# Altium integrated library CoLib.IntLib: 649 symbols (part 2 of 5) (continued)
## DB9-RF
designator J?
D-SUB 9pin,母头,90度; Manufacturer: HARTING; Name: DB-9母头; Ordering NO.: 09661536612; Tips: TUV认证
footprint DB9-RF (DB9 卧式间距1.385 mm,母头)
pins: 1, 2, 3, 4, 5, 6, 7, 8, 9, 10 MH2, 11 MH1

## DB9-RM
designator J?
D-SUB 9pin, 公头,90度; Manufacturer: HARTING; Name: DB-9公头; Ordering NO.: 09651636812; Tips: TUV认证
footprint DB9-RM (DB9 卧式间距1.385 mm,公头)
pins: 1, 2, 3, 4, 5, 6, 7, 8, 9, 10 MH1, 11 MH2

## DB15/VGA
designator J?
D-SUB 15pin,3排,90度,VGA接插件; Manufacturer: 南士; 物料替代型号: 同型; Tips: VGA 15孔卧式座; Name: DB-15,VGA接插件; Ordering NO.: 3排 DB15/VGA座,卧式; Price: 1.5
footprint DB15-R (patch=90mil,100mil,VGA插座)
pins: 1, 2, 3, 4, 5, 6, 7, 8, 9, 10, 11, 12, 13, 14, 15, 16, 17
text: VGA15P

## DB37-RF
designator J?
D-SUB 37pin,母头,90度; Manufacturer: HARTING; Name: DB-37（90度母头）; Ordering NO.: 09654636812; Tips: TUV认证
footprint DB37-RF (37PIN,直插, 弯)
pins: 1, 2, 3, 4, 5, 6, 7, 8, 9, 10, 11, 12, 13, 14, 15, 16, 17, 18, 19, 20, 21, 22, 23, 24, 25, 26, 27, 28, 29, 30, 31, 32, 33, 34, 35, 36, 37, A, B

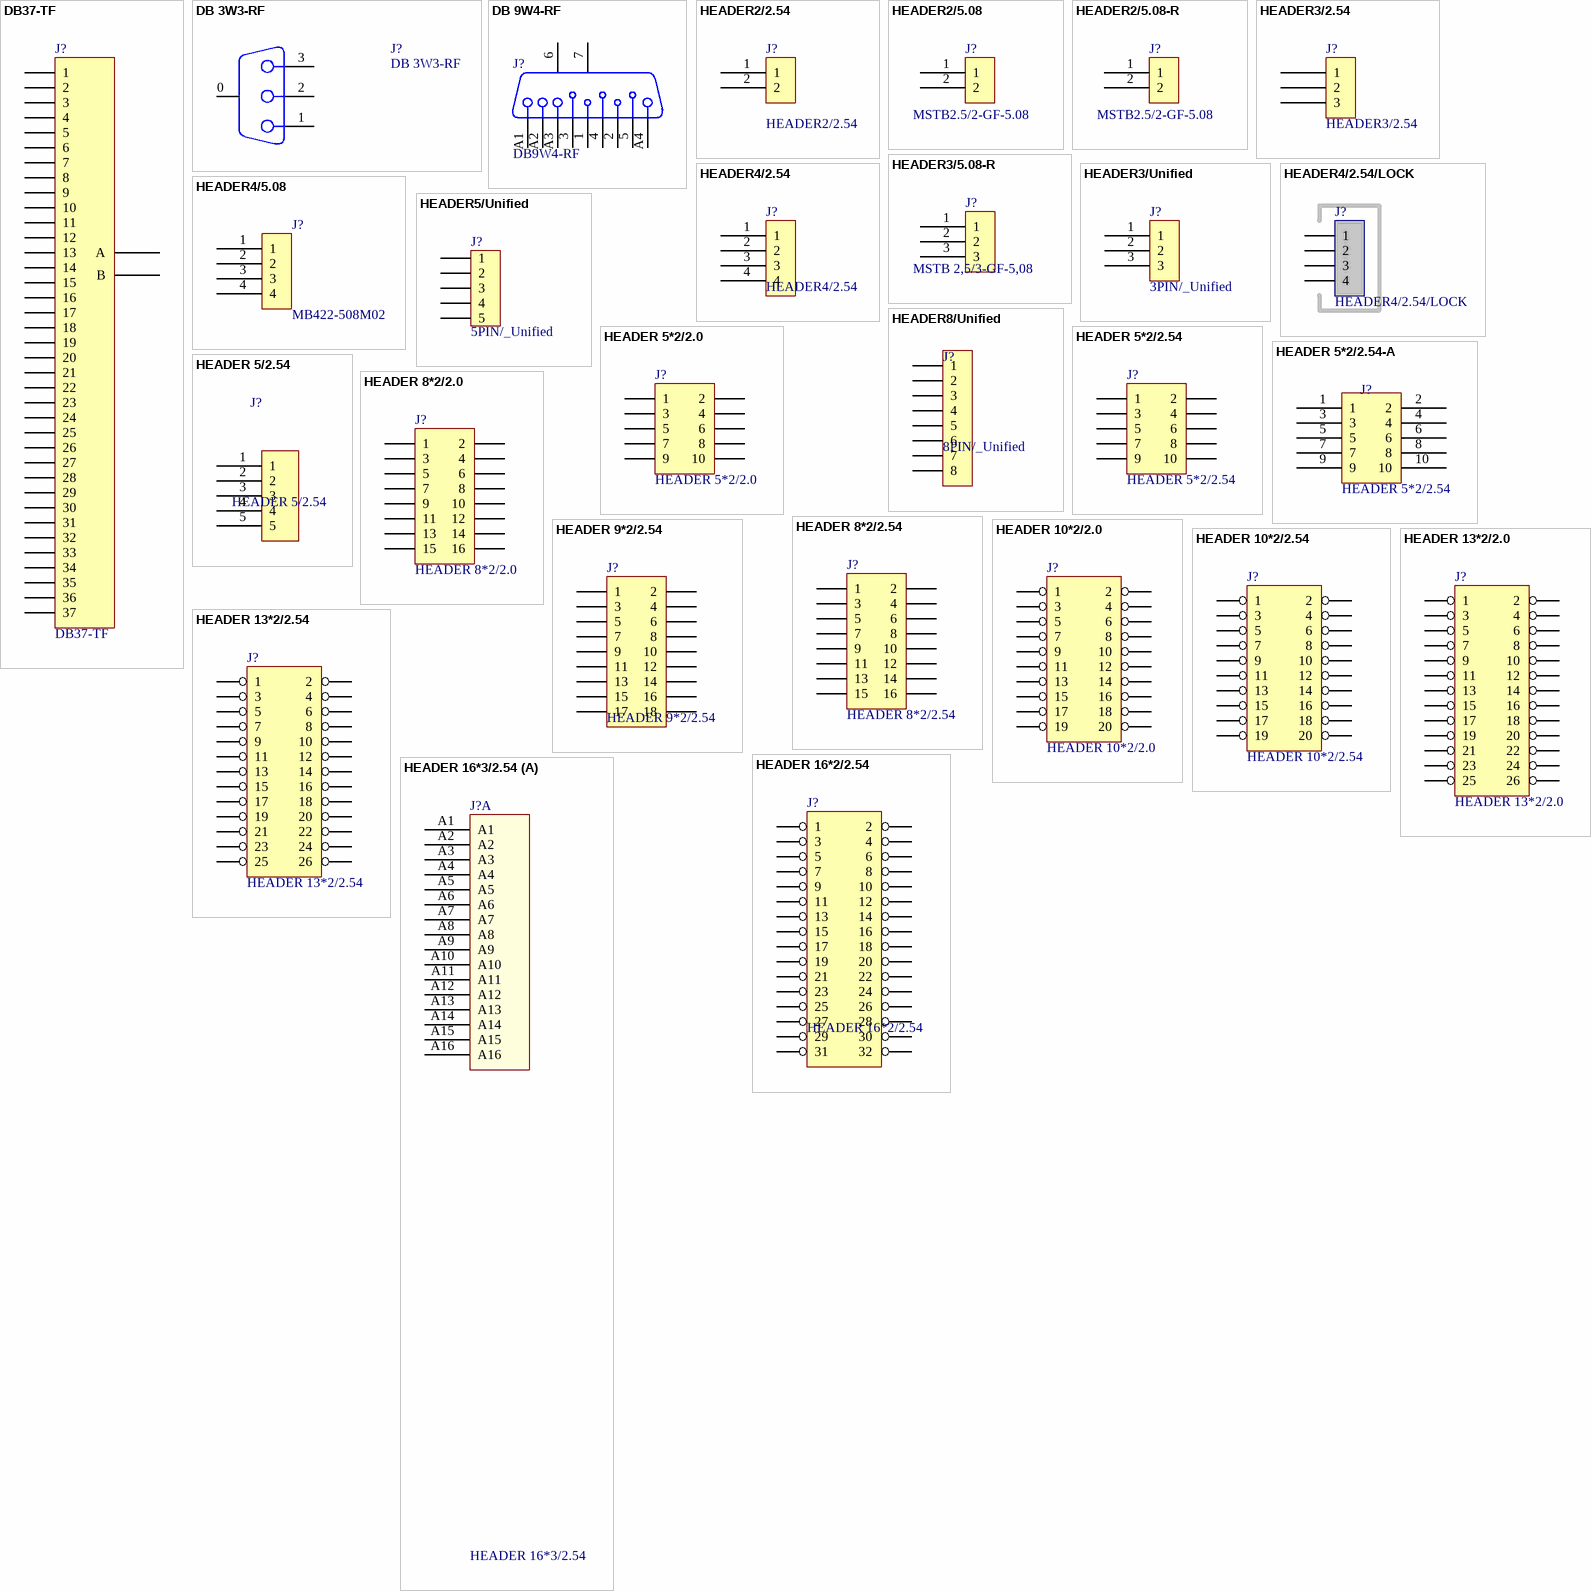
[diagram p10: symbols DB37-TF to HEADER 16*3/2.54]

## DB37-TF
designator J?
D-SUB 37pin,母头,180度; Manufacturer: HARTING; Name: DB-37（180度母头）; Ordering NO.: 09664116503; Tips: TUV认证
footprint DB37-TF (37PIN,直插, 直)
pins: 1, 2, 3, 4, 5, 6, 7, 8, 9, 10, 11, 12, 13, 14, 15, 16, 17, 18, 19, 20, 21, 22, 23, 24, 25, 26, 27, 28, 29, 30, 31, 32, 33, 34, 35, 36, 37, A, B

## DB 3W3-RF
designator J?
D-SUB 3W3,母头,90度; Manufacturer: 优联康; Ordering NO.: UL0.14W8.3W32; Name: DB-3W3
footprint DB3-RF (D-SUB 3W3 弯脚,母座，pitch 6.86mm,)
pins: 0, 1, 2, 3

## DB 9W4-RF
designator J?, comment DB9W4-RF
D-SUB 9W4,母头,90度; Manufacturer: HARTING; Name: DB-9W4; Ordering NO.: TB09693009106
footprint DB9-RF-A (Footprint not found)
pins: 1, 2, 3, 4, 5, 6 MH2, 7 MH1, A1, A2, A3, A4

## HEADER2/2.54
designator J?
2pin,单排,2.54mm间距; Manufacturer: 南士; Name: 2pin,单排,2.54mm间距插针; Price: 0.01; Ordering NO.: 2pin,单排,2.54mm间距
footprint SIP2/2.54 (单排2.54插针, 焊盘: 外径1.5mm,孔径1mm)
pins: 1, 2

## HEADER2/5.08
designator J?, comment MSTB2.5/2-GF-5.08
2pin,单排,5.08mm间距; Manufacturer: Failschild; Name: 端子座; Ordering NO.: MKDS 3/2-5.08
footprint SIP2/5.08
pins: 1, 2

## HEADER2/5.08-R
designator J?, comment MSTB2.5/2-GF-5.08
2pin,单排,5.08mm间距,90度; Manufacturer: 南士; Name: 2pin,单排,5.08mm间距,90度插座; Ordering NO.: MSTB2.5/2-GF-5.08
footprint PMR2/5.08-R
pins: 1, 2

## HEADER3/2.54
designator J?
3pin,单排,2.54mm间距; Manufacturer: 南士; Name: 3pin,单排,2.54mm间距插针; Ordering NO.: 3pin,单排,2.54mm间距
footprint SIP3/2.54 (单排2.54插针, 焊盘: 外径1.5mm,孔径1mm)
footprint 通用3pin,单排,2.54mm间距 (Footprint not found)
pins: 1, 2, 3

## HEADER3/5.08-R
designator J?, comment MSTB 2,5/3-GF-5,08
3pin,单排,5.08mm间距,90度; Manufacturer: Phoenix; Name: 3pin,单排,5.08mm间距,90度插座; Ordering NO.: MSTB 2,5/3-GF-5,08
footprint PMR3/5.08-R
pins: 1, 2, 3

## HEADER3/Unified
designator J?, comment 3PIN/_Unified
3pin,单排,2.54mm间距; Manufacturer: 南士; Ordering NO.: 3pin,单排,2.54mm间距 白座直针; Name: 3pin,单排,2.54mm间距
footprint SIP3/2.0 (单排2.0插针, 焊盘: 外径1.2mm,孔径0.7mm)
footprint SIP3/2.54/LOCK (带锁单排2.54插针, 焊盘: 外径1.5mm,孔径1mm)
pins: 1, 2, 3

## HEADER4/2.54
designator J?
4pin, 单排,2.0mm间距; Manufacturer: 南士; Name: 直插单排插针; Ordering NO.: 单排4pin直针间距2.54mm
footprint SIP4/2.54 (不带锁单排2.54插针, 焊盘: 外径1.5mm,孔径1mm)
pins: 1, 2, 3, 4

## HEADER4/2.54/LOCK
designator J?
4pin,单排,2.54mm间距,白座; Manufacturer: 南士; Name: 4针2.54白座; Ordering NO.: 单排4pin 2.54mm间距 白座直针; Tips: n/a; 物料替代型号: n/a; Price: 0.2
footprint SIP4/2.54/LOCK (带锁单排2.54插针, 焊盘: 外径1.5mm,孔径1mm)
pins: 1, 2, 3, 4

## HEADER4/5.08
designator J?, comment MB422-508M02
4Pin的电源端子,需要2个MB422-508M02组合成1个; Manufacturer: 进联; Name: 端子座; Tips: 给端子板使用; Ordering NO.: MB422-508M02
footprint DIP4/5.08mm (端子板电源端子)
pins: 1, 2, 3, 4

## HEADER5/Unified
designator J?, comment 5PIN/_Unified
5pin,单排,2.54mm间距; Manufacturer: 南士; Name: 5pin,单排,2.54mm间距插针; Ordering NO.: 5pin,单排,2.54mm间距 白座直针
footprint SIP5/2.54/LOCK (带锁单排2.54插针, 焊盘: 外径1.5mm,孔径1mm)
pins: 1, 2, 3, 4, 5

## HEADER8/Unified
designator J?, comment 8PIN/_Unified
8pin,单排,2.54mm间距; Manufacturer: 南士; Name: 8pin,单排,2.54mm间距插针; Ordering NO.: 8pin,单排,2.54mm间距
footprint SIP8/2.54 (Footprint not found)
pins: 1, 2, 3, 4, 5, 6, 7, 8

## HEADER 5*2/2.0
designator J?
10pin, 双排,2.0mm间距; Manufacturer: 南士; Tips: 10直针2.0; Name: 10pin, 双排,2.0mm间距插针; Ordering NO.: 双排10pin直针,间距2.0mm; 物料替代型号: n/a; Price: 0.10
footprint DIP10/2.0 (间距2.0插针,焊盘:外径1.4mm.孔径0.7mm)
pins: 1, 2, 3, 4, 5, 6, 7, 8, 9, 10

## HEADER 5*2/2.54
designator J?
简易牛角座, 10pin,双排, 2.54mm间距; Manufacturer: 南士; Ordering NO.: 302S-10P; Name: 简易牛角座
footprint IDC2*5/2.54 (2.54间距插针, 焊盘:外径1.57mm.孔径0.9mm)
pins: 1, 2, 3, 4, 5, 6, 7, 8, 9, 10

## HEADER 5*2/2.54-A
designator J?, comment HEADER 5*2/2.54
10pin,双排, 2.54mm间距; Manufacturer: 南士; Name: 10pin,双排, 2.54mm间距插针; Ordering NO.: 10pin,双排, 2.54mm间距
footprint DIP10/2.54 (Footprint not found)
pins: 1, 2, 3, 4, 5, 6, 7, 8, 9, 10

## HEADER 5/2.54
designator J?
5pin,单排, 2.54mm间距; Manufacturer: 南士; Name: 5pin,单排, 2.54mm间距插针; Ordering NO.: 5pin,单排, 2.54mm间距
footprint SIP5/2.54 (Footprint not found)
pins: 1, 2, 3, 4, 5

## HEADER 8*2/2.0
designator J?
16pin,双排,2.0mm间距; Manufacturer: 南士; 物料替代型号: 国产通用; Name: 16pin,双排,2.0mm间距 插针; Ordering NO.: 针16pin 2.0间距; Tips: n/a; Price: 0.24
footprint DIP16/2.0 (Footprint not found)
pins: 1, 2, 3, 4, 5, 6, 7, 8, 9, 10, 11, 12, 13, 14, 15, 16

## HEADER 8*2/2.54
designator J?
16pin,双排,2.54mm间距; Manufacturer: 南士; 物料替代型号: 国产通用; Tips: 镀金双排针; Name: 16pin,双排,2.54mm间距插针; Ordering NO.: 镀金双排针16pin 2.54间距; Price: 0.24
footprint DIP16/2.54 (Footprint not found)
pins: 1, 2, 3, 4, 5, 6, 7, 8, 9, 10, 11, 12, 13, 14, 15, 16

## HEADER 9*2/2.54
designator J?
18pin,双排,2.54mm间距; Manufacturer: 南士; 物料替代型号: 国产通用; Tips: 镀金双排针; Name: 18pin,双排,2.54mm间距插针; Ordering NO.: 镀金双排针18pin 2.54间距; Price: 0.24
footprint DIP18/2.54 (Footprint not found)
pins: 1, 2, 3, 4, 5, 6, 7, 8, 9, 10, 11, 12, 13, 14, 15, 16, 17, 18

## HEADER 10*2/2.0
designator J?
20pin, 双排,2.0mm间距; Manufacturer: 南士; Name: 20pin, 双排,2.0mm间距插针; Price: 0.4; Ordering NO.: 20pin, 双排,2.0mm间距
footprint DIP20/2.0 (Footprint not found)
pins: 1, 2, 3, 4, 5, 6, 7, 8, 9, 10, 11, 12, 13, 14, 15, 16, 17, 18, 19, 20

## HEADER 10*2/2.54
designator J?
20pin, 双排,2.54mm间距; Manufacturer: 南士; Name: 20pin, 双排,2.54mm间距插针; Price: 0.4; Ordering NO.: 20pin, 双排,2.54mm间距
footprint DIP20/2.54 (Footprint not found)
pins: 1, 2, 3, 4, 5, 6, 7, 8, 9, 10, 11, 12, 13, 14, 15, 16, 17, 18, 19, 20

## HEADER 13*2/2.0
designator J?
26pin, 双排,2.0mm间距; Manufacturer: 南士; Name: 26pin, 双排,2.0mm间距插针; Ordering NO.: 26pin, 双排,2.0mm间距
footprint DIP26/2.0 (间距2.0插针,焊盘:外径1.4mm.孔径0.7mm)
pins: 1, 2, 3, 4, 5, 6, 7, 8, 9, 10, 11, 12, 13, 14, 15, 16, 17, 18, 19, 20, 21, 22, 23, 24, 25, 26

## HEADER 13*2/2.54
designator J?
26pin, 双排,2.54mm间距; Manufacturer: 南士; Name: 26pin, 双排,2.54mm间距插针; Ordering NO.: 26pin, 双排,2.54mm间距
footprint DIP26/2.54 (2.54间距插针, 焊盘:外径1.57mm.孔径0.9mm)
pins: 1, 2, 3, 4, 5, 6, 7, 8, 9, 10, 11, 12, 13, 14, 15, 16, 17, 18, 19, 20, 21, 22, 23, 24, 25, 26

## HEADER 16*2/2.54
designator J?
32pin, 双排,2.54mm间距; Manufacturer: 南士; Name: 32pin, 双排,2.54mm间距插针; Ordering NO.: 32pin, 双排,2.54mm间距
footprint DIP32/2.54 (Footprint not found)
pins: 1, 2, 3, 4, 5, 6, 7, 8, 9, 10, 11, 12, 13, 14, 15, 16, 17, 18, 19, 20, 21, 22, 23, 24, 25, 26, 27, 28, 29, 30, 31, 32

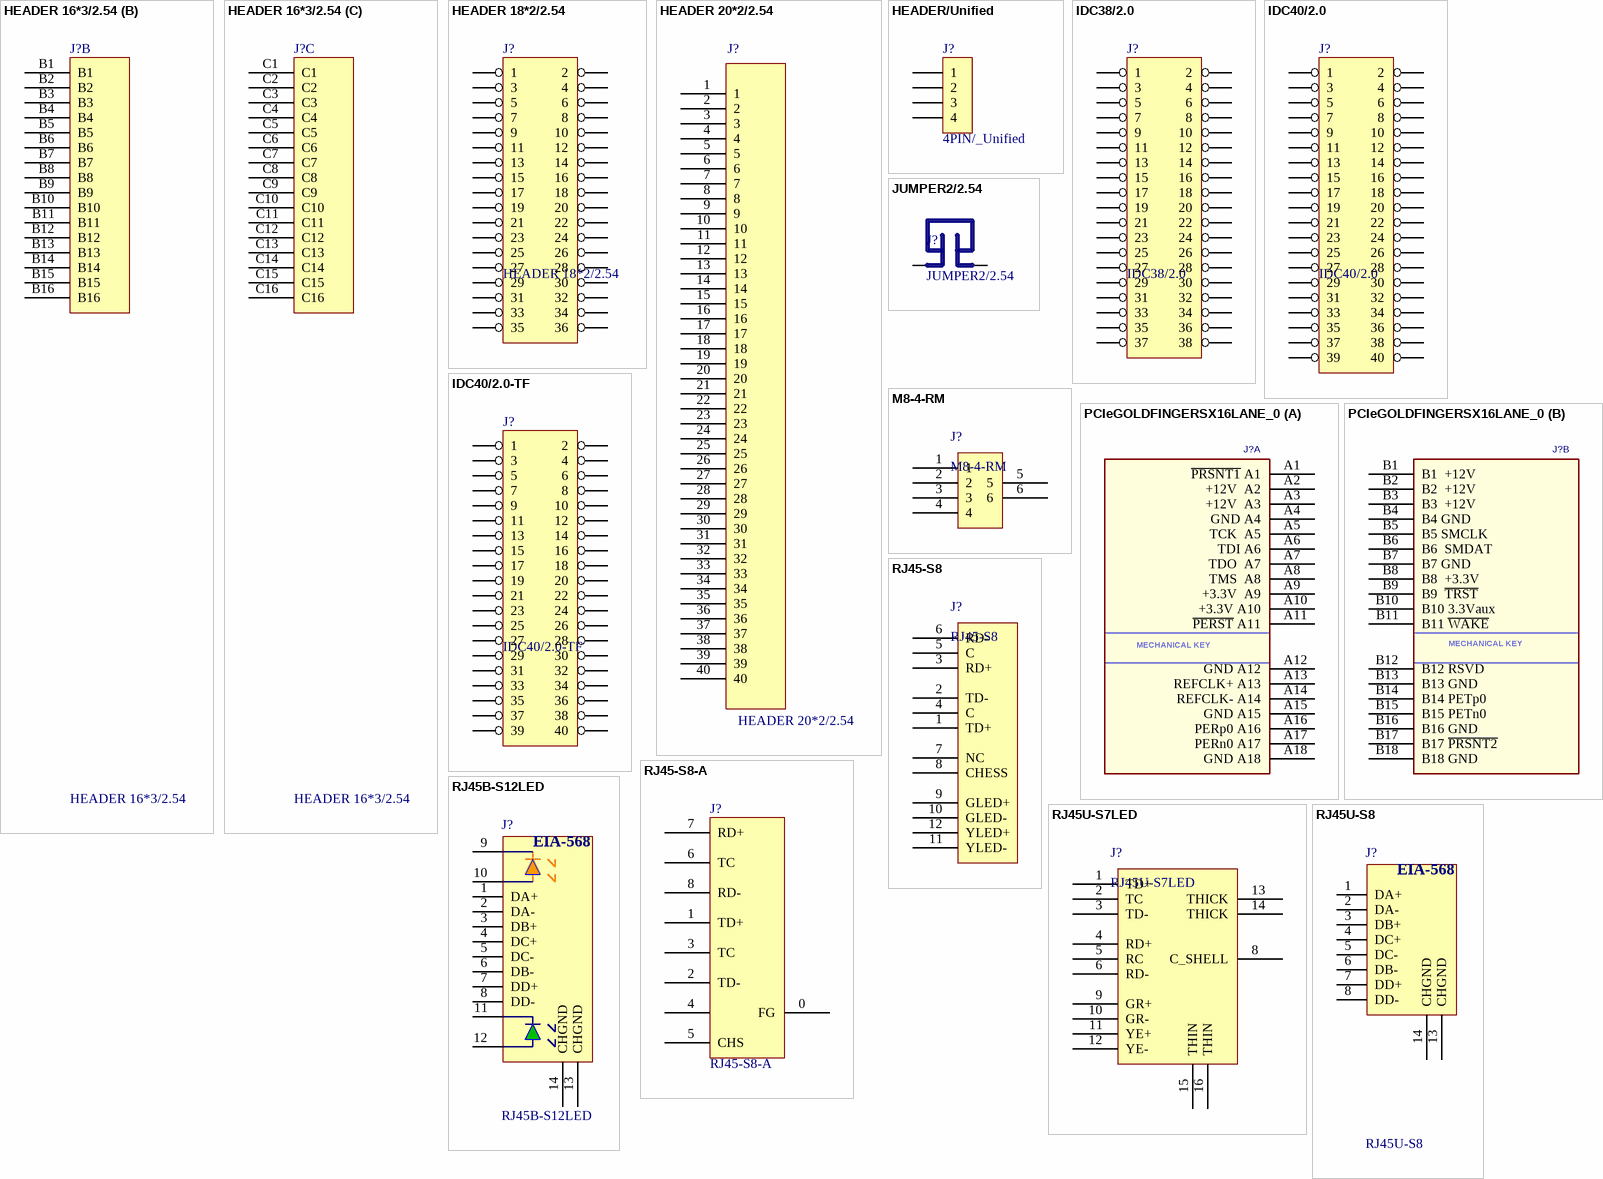
[diagram p11: symbols HEADER 16*3/2.54 to RJ45U-S8]

## HEADER 16*3/2.54
designator J?
48pin,3排,2.54mm间距; Manufacturer: 南士; Name: 48pin,3排,2.54mm间距插针; Ordering NO.: 48pin,3排,2.54mm间距
footprint PMR3*16/2.54-T (Footprint not found)
part A pins: A1, A2, A3, A4, A5, A6, A7, A8, A9, A10, A11, A12, A13, A14, A15, A16
part B pins: B1, B2, B3, B4, B5, B6, B7, B8, B9, B10, B11, B12, B13, B14, B15, B16
part C pins: C1, C2, C3, C4, C5, C6, C7, C8, C9, C10, C11, C12, C13, C14, C15, C16

## HEADER 18*2/2.54
designator J?
36pin, 双排,2.54mm间距; Manufacturer: 南士; Name: 36pin, 双排,2.54mm间距插针; Ordering NO.: 36pin, 双排,2.54mm间距插针
footprint DIP36/2.54 (Footprint not found)
pins: 1, 2, 3, 4, 5, 6, 7, 8, 9, 10, 11, 12, 13, 14, 15, 16, 17, 18, 19, 20, 21, 22, 23, 24, 25, 26, 27, 28, 29, 30, 31, 32, 33, 34, 35, 36

## HEADER 20*2/2.54
designator J?
40pin, 双排,2.54mm间距; Manufacturer: 南士; Name: 40pin, 双排,2.54mm间距插针; Ordering NO.: 40pin, 双排,2.54mm间距
footprint DIP40/2.54
pins: 1, 2, 3, 4, 5, 6, 7, 8, 9, 10, 11, 12, 13, 14, 15, 16, 17, 18, 19, 20, 21, 22, 23, 24, 25, 26, 27, 28, 29, 30, 31, 32, 33, 34, 35, 36, 37, 38, 39, 40

## HEADER/Unified
designator J?, comment 4PIN/_Unified
4pin,单排,2.54mm间距; Manufacturer: 南士; Name: 4pin,单排,2.54mm间距插针; Ordering NO.: 4pin,单排,2.54mm间距
footprint SIP4/2.0 (单排2.0插针, 焊盘: 外径1.2mm,孔径0.7mm)
footprint SIP4/2.54 (不带锁单排2.54插针, 焊盘: 外径1.5mm,孔径1mm)
footprint SIP4/2.54/LOCK (带锁单排2.54插针, 焊盘: 外径1.5mm,孔径1mm)
footprint IDC2*2/2.54 (2.54间距插针, 焊盘:外径1.57mm.孔径0.9mm)
pins: 1, 2, 3, 4

## IDC38/2.0
designator J?
38pin,双排,2.0mm间距; Manufacturer: 南士; Name: IDC连接器; Price: 0.8; Ordering NO.: 38pin,双排,2.0mm间距
footprint IDC38/2.0 (间距2.0插针,焊盘:外径1.4mm.孔径0.7mm)
pins: 1, 2, 3, 4, 5, 6, 7, 8, 9, 10, 11, 12, 13, 14, 15, 16, 17, 18, 19, 20, 21, 22, 23, 24, 25, 26, 27, 28, 29, 30, 31, 32, 33, 34, 35, 36, 37, 38

## IDC40/2.0
designator J?
40pin,双排,2.0mm间距; Manufacturer: 南士; Tips: 2.0间距; Name: IDC连接器; 物料替代型号: n/a; Ordering NO.: 40pin,双排,2.0mm间距; Price: 0.8
footprint DIP40/2.0 (间距2.0插针,焊盘:外径1.4mm.孔径0.7mm)
pins: 1, 2, 3, 4, 5, 6, 7, 8, 9, 10, 11, 12, 13, 14, 15, 16, 17, 18, 19, 20, 21, 22, 23, 24, 25, 26, 27, 28, 29, 30, 31, 32, 33, 34, 35, 36, 37, 38, 39, 40

## IDC40/2.0-TF
designator J?
40pin,双排,2.0mm间距,180度,母头; Manufacturer: 南士; Tips: 2.0间距; Name: IDC连接器; 物料替代型号: n/a; Ordering NO.: 40pin,双排,2.0mm间距,180度,母头; Price: 0.8
footprint DIP40/2.0 (间距2.0插针,焊盘:外径1.4mm.孔径0.7mm)
pins: 1, 2, 3, 4, 5, 6, 7, 8, 9, 10, 11, 12, 13, 14, 15, 16, 17, 18, 19, 20, 21, 22, 23, 24, 25, 26, 27, 28, 29, 30, 31, 32, 33, 34, 35, 36, 37, 38, 39, 40

## JUMPER2/2.54
designator J?
跳线器2pin,2.54mm间距; Manufacturer: 南士; Tips: 镀金2针; 物料替代型号: 国产通用; Name: 2针跳线器; Ordering NO.: 镀金针2pin 2.54间距; Price: 0.02
footprint SIP2/2.54 (单排2.54插针, 焊盘: 外径1.5mm,孔径1mm)
pins: 1, 2
2 alternate drawings of the same symbol

## M8-4-RM
designator J?
M8针式插头连接器,4芯,公头,90度; Manufacturer: 菲尼克斯; Ordering NO.: SACC-DSI-M8MS-4CON-L90 SH; Name: M8针式插头连接器
footprint M8-4-RM (M8针式插头连接器，4芯，公头，弯脚)
pins: 1, 2, 3, 4, 5, 6

## PCIeGOLDFINGERSX16LANE_0
designator J?  (value not drawn)  (no BOM)
PCIe金手指; Price: 1.01; Name: PCIe金手指; Ordering NO.: PCIeGOLDFINGERSX16LANE_0
footprint PCIE36 (PCIe1X金手指插头)
part A pins: A1 ~{PRSNT1} A1, A2 +12V  A2, A3 +12V  A3, A4 GND A4, A5 TCK  A5, A6 TDI A6, A7 TDO  A7, A8 TMS  A8, A9 +3.3V  A9, A10 +3.3V A10, A11 ~{PERST} A11, A12 GND A12, A13 REFCLK+ A13, A14 REFCLK- A14, A15 GND A15, A16 PERp0 A16, A17 PERn0 A17, A18 GND A18
part B pins: B1 B1  +12V, B2 B2  +12V, B3 B3  +12V, B4 B4 GND, B5 B5 SMCLK, B6 B6  SMDAT, B7 B7 GND, B8 B8  +3.3V, B9 B9  ~{TRST}, B10 B10 3.3Vaux, B11 B11 ~{WAKE}, B12 B12 RSVD, B13 B13 GND, B14 B14 PETp0, B15 B15 PETn0, B16 B16 GND, B17 B17 ~{PRSNT2}, B18 B18 GND
part A text: MECHANICAL KEY
part B text: MECHANICAL KEY

## RJ45-S8
designator J?
带磁体RJ45壳体; Name: RJ45座; Ordering NO.: HR9111105A; Price: 3.5
footprint RJ45-8T-Y-L (带磁芯LED的RJ45座)
pins: 1 TD+, 2 TD-, 3 RD+, 4 C, 5 C, 6 RD-, 7 NC, 8 CHESS, 9 GLED+, 10 GLED-, 11 YLED-, 12 YLED+

## RJ45-S8-A
designator J?
Name: RJ45座; Ordering NO.: HR901103A
footprint RJ45-8T
pins: 0 FG, 1 TD+, 2 TD-, 3 TC, 4, 5 CHS, 6 TC, 7 RD+, 8 RD-

## RJ45B-S12LED
designator J?
RJ45底联12针带灯; Manufacturer: AMP; 物料替代型号: 国产; Tips: 带灯座底联; Name: RJ45带灯座; Ordering NO.: RJ45B-S12LED; Price: 1.99
footprint RJ45-8T-L (Footprint not found)
pins: 1 DA+, 2 DA-, 3 DB+, 4 DC+, 5 DC-, 6 DB-, 7 DD+, 8 DD-, 9, 10, 11, 12, 13 CHGND, 14 CHGND
text: EIA-568

## RJ45U-S7LED
designator J?
汉仁防雷带磁体RJ45座上联; Manufacturer: HanRun; Tips: 防雷商用温度; Ordering NO.: HR871159C; Name: RJ45带灯座; Price: 15
footprint RJ45-7T-Z-L (HR871159防雷带磁体LEDRJ45座)
pins: 1 TD+, 2 TC, 3 TD-, 4 RD+, 5 RC, 6 RD-, 8 C_SHELL, 9 GR+, 10 GR-, 11 YE+, 12 YE-, 13 THICK, 14 THICK, 15 THIN, 16 THIN

## RJ45U-S8
designator J?
RJ45顶联8针不带灯; Name: RJ45座; Price: 0.88
footprint RJ45U-S8 (上联型，不带灯)
pins: 1 DA+, 2 DA-, 3 DB+, 4 DC+, 5 DC-, 6 DB-, 7 DD+, 8 DD-, 13 CHGND, 14 CHGND
text: EIA-568


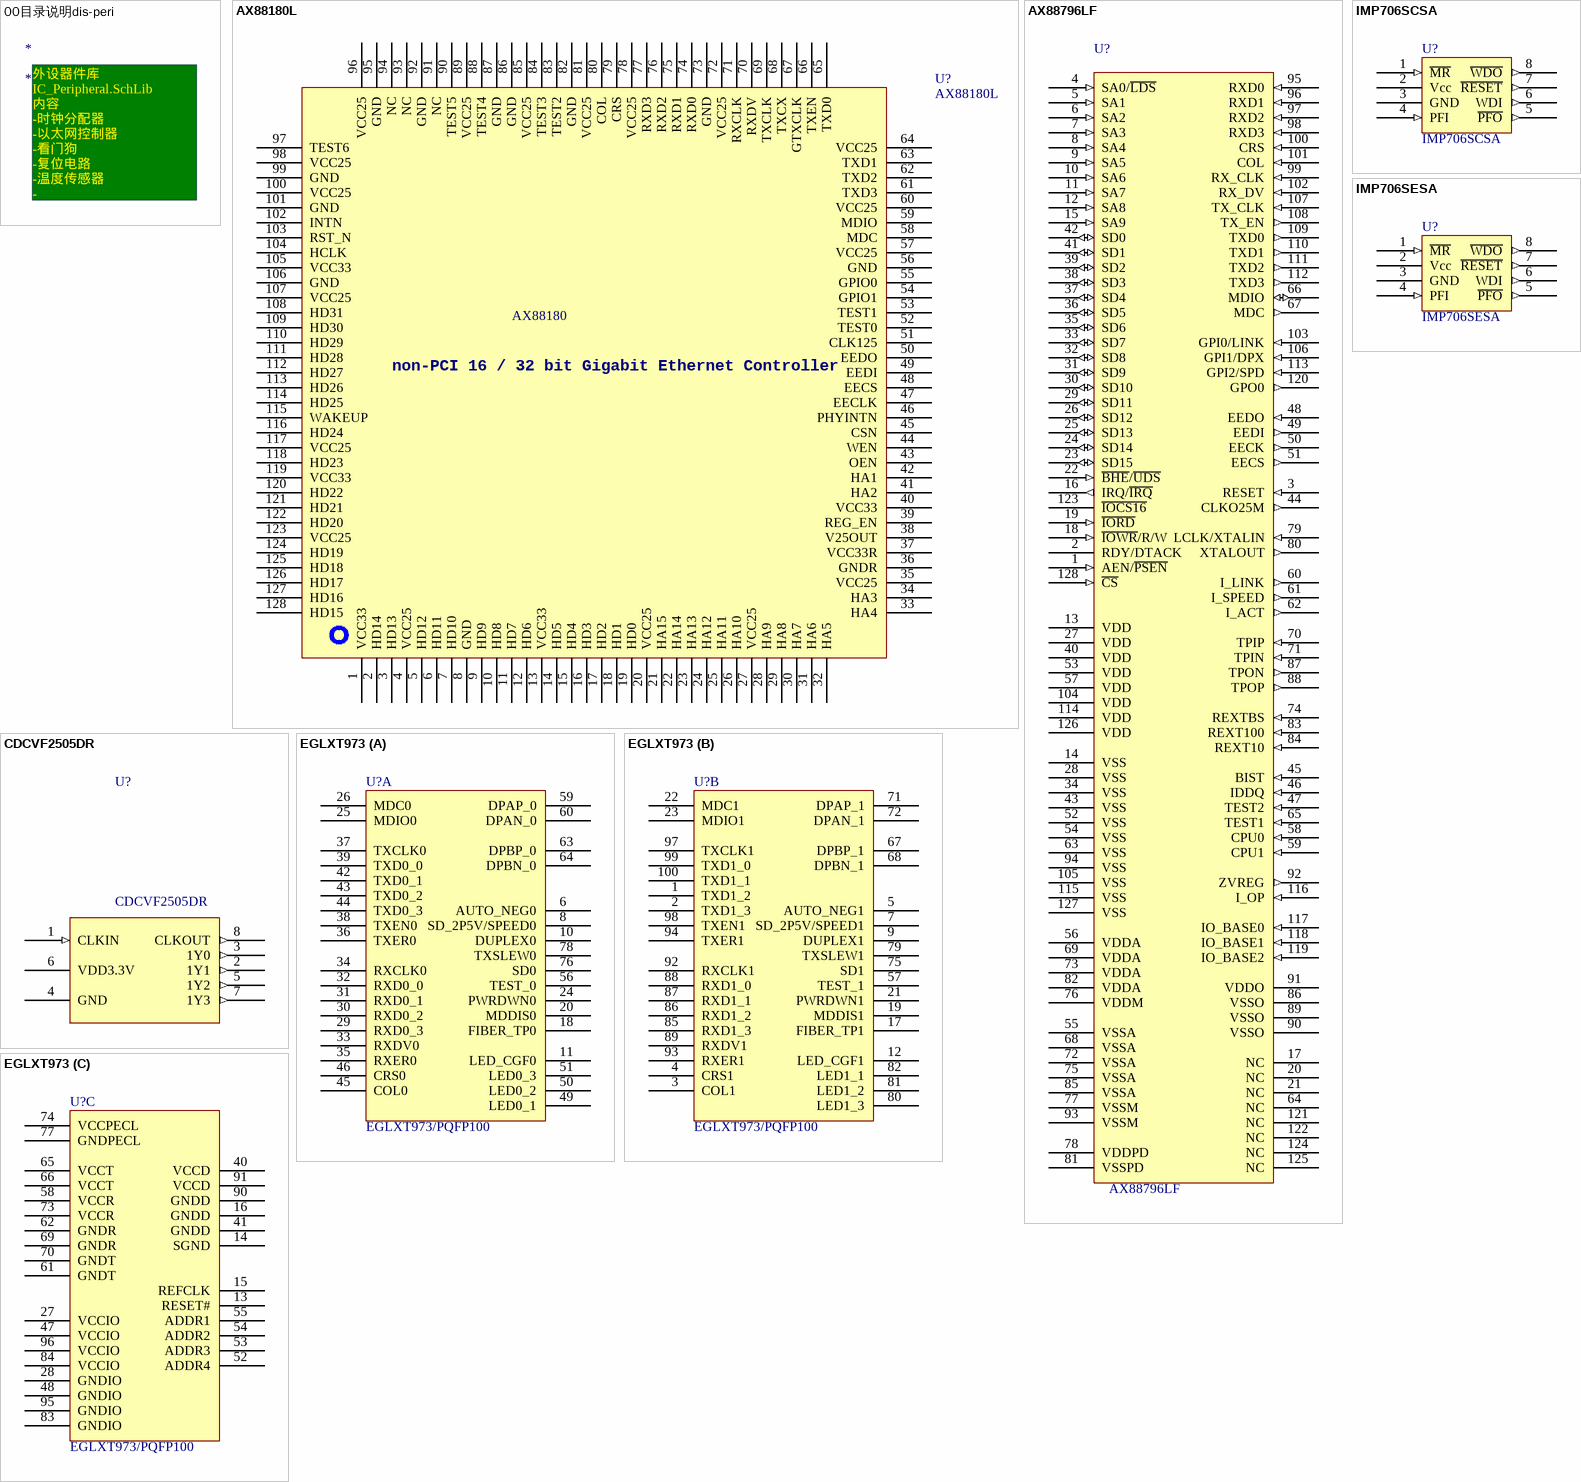
[diagram p12: symbols 00目录说明dis-peri to IMP706SESA]

## 00目录说明dis-peri
designator *
text: 外设器件库 IC_Peripheral.SchLib / 内容 / -时钟分配器 / -以太网控制器 / -看门狗 / -复位电路 / -温度传感器 / - /

## AX88180L
designator U?
High-Performance Non-PCI    32-bit 10/100/1000M Gigabit Ethernet Controller; Manufacturer: ASIX; Name: 千兆以太网控制器仅MAC部分; 物料型号说明: 千兆MAC; Price_Date: 2011-07; Price: 35; 物料替代型号: n/a; Ordering NO.: AX88180L
footprint LQFP128/0.4_14*14 (Shrink QFP, 128-Leads, Body 14x14mm, Pitch 0.4mm, IPC High Density)
pins: 1 VCC33, 2 HD14, 3 HD13, 4 VCC25, 5 HD12, 6 HD11, 7 HD10, 8 GND, 9 HD9, 10 HD8, 11 HD7, 12 HD6, 13 VCC33, 14 HD5, 15 HD4, 16 HD3, 17 HD2, 18 HD1, 19 HD0, 20 VCC25, 21 HA15, 22 HA14, 23 HA13, 24 HA12, 25 HA11, 26 HA10, 27 VCC25, 28 HA9, 29 HA8, 30 HA7, 31 HA6, 32 HA5, 33 HA4, 34 HA3, 35 VCC25, 36 GNDR, 37 VCC33R, 38 V25OUT, 39 REG_EN, 40 VCC33, 41 HA2, 42 HA1, 43 OEN, 44 WEN, 45 CSN, 46 PHYINTN, 47 EECLK, 48 EECS, 49 EEDI, 50 EEDO, 51 CLK125, 52 TEST0, 53 TEST1, 54 GPIO1, 55 GPIO0, 56 GND, 57 VCC25, 58 MDC, 59 MDIO, 60 VCC25, 61 TXD3, 62 TXD2, 63 TXD1, 64 VCC25, 65 TXD0, 66 TXEN, 67 GTXCLK, 68 TXCX, 69 TXCLK, 70 RXDV, 71 RXCLK, 72 VCC25, 73 GND, 74 RXD0, 75 RXD1, 76 RXD2, 77 RXD3, 78 VCC25, 79 CRS, 80 COL, 81 VCC25, 82 GND, 83 TEST2, 84 TEST3, 85 VCC25, 86 GND, 87 GND, 88 TEST4, 89 VCC25, 90 TEST5, 91 NC, 92 GND, 93 NC, 94 NC, 95 GND, 96 VCC25, 97 TEST6, 98 VCC25, 99 GND, 100 VCC25, 101 GND, 102 INTN, 103 RST_N, 104 HCLK, 105 VCC33, 106 GND, 107 VCC25, 108 HD31, 109 HD30, 110 HD29, 111 HD28, 112 HD27, 113 HD26, 114 HD25, 115 WAKEUP, 116 HD24, 117 VCC25, 118 HD23, 119 VCC33, 120 HD22, 121 HD21, 122 HD20, 123 VCC25, 124 HD19, 125 HD18, 126 HD17, 127 HD16, 128 HD15
text: AX88180; non-PCI 16 / 32 bit / Gigabit Ethernet Controller

## AX88796LF
designator U?
3-in-1 Local BUus Fast Ethernet Controller with Embedded SRAM; Manufacturer: ASIX; Name: 以太网控制器; Ordering NO.: AX88796LF
footprint LQFP128/0.5_20*14
pins: 1 AEN/~{PSEN} (in), 2 RDY/DTACK, 3 RESET (in), 4 SA0/~{LDS} (in), 5 SA1 (in), 6 SA2 (in), 7 SA3 (in), 8 SA4 (in), 9 SA5 (in), 10 SA6 (in), 11 SA7 (in), 12 SA8 (in), 13 VDD (power), 14 VSS (power), 15 SA9 (in), 16 IRQ/~{IRQ} (out), 17 NC, 18 ~{IOWR}/R/W (in), 19 ~{IORD} (in), 20 NC, 21 NC, 22 ~{BHE}/~{UDS} (in), 23 SD15 (io), 24 SD14 (io), 25 SD13 (io), 26 SD12 (io), 27 VDD (power), 28 VSS (power), 29 SD11 (io), 30 SD10 (io), 31 SD9 (io), 32 SD8 (io), 33 SD7 (io), 34 VSS (power), 35 SD6 (io), 36 SD5 (io), 37 SD4 (io), 38 SD3 (io), 39 SD2 (io), 40 VDD (power), 41 SD1 (io), 42 SD0 (io), 43 VSS (power), 44 CLKO25M (out), 45 BIST (in), 46 IDDQ (in), 47 TEST2 (in), 48 EEDO (in), 49 EEDI (out), 50 EECK (out), 51 EECS (out), 52 VSS (power), 53 VDD (power), 54 VSS (power), 55 VSSA (power), 56 VDDA (power), 57 VDD (power), 58 CPU0 (in), 59 CPU1 (in), 60 I_LINK (out), 61 I_SPEED (out), 62 I_ACT (out), 63 VSS (power), 64 NC, 65 TEST1 (in), 66 MDIO (io), 67 MDC (out), 68 VSSA (power), 69 VDDA (power), 70 TPIP (in), 71 TPIN (in), 72 VSSA (power), 73 VDDA (power), 74 REXTBS (in), 75 VSSA (power), 76 VDDM (power), 77 VSSM (power), 78 VDDPD (power), 79 LCLK/XTALIN (in), 80 XTALOUT (out), 81 VSSPD (power), 82 VDDA (power), 83 REXT100 (in), 84 REXT10 (in), 85 VSSA (power), 86 VSSO (power), 87 TPON (out), 88 TPOP (out), 89 VSSO (power), 90 VSSO (power), 91 VDDO (power), 92 ZVREG (out), 93 VSSM (power), 94 VSS (power), 95 RXD0 (in), 96 RXD1 (in), 97 RXD2 (in), 98 RXD3 (in), 99 RX_CLK (in), 100 CRS (in), 101 COL (in), 102 RX_DV (in), 103 GPI0/LINK (in), 104 VDD (power), 105 VSS (power), 106 GPI1/DPX (in), 107 TX_CLK (in), 108 TX_EN (out), 109 TXD0 (out), 110 TXD1 (out), 111 TXD2 (out), 112 TXD3 (out), 113 GPI2/SPD (in), 114 VDD (power), 115 VSS (power), 116 I_OP (in), 117 IO_BASE0 (in), 118 IO_BASE1 (in), 119 IO_BASE2 (in), 120 GPO0 (out), 121 NC, 122 NC, 123 ~{IOCS16}, 124 NC, 125 NC, 126 VDD (power), 127 VSS (power), 128 ~{CS} (in)

## CDCVF2505DR
designator U?
3.3V CLODK PHASE-LOCK LOOP CLOCK DRIVER; Manufacturer: TI; Name: 锁相环时钟驱动器; 物料型号说明: SO-8封装; Price: 25; 物料替代型号: n/a; Ordering NO.: CDCVF2505DR
footprint SO8/1.27_4.9*3.9 (SOIC, 8-Leads, Body 4.9x3.9mm, Pitch 1.27mm,)
pins: 1 CLKIN (in), 2 1Y1 (out), 3 1Y0 (out), 4 GND (power), 5 1Y2 (out), 6 VDD3.3V (power), 7 1Y3 (out), 8 CLKOUT (out)

## EGLXT973
designator U?, comment EGLXT973/PQFP100
双100TX/FX PHY; Manufacturer: Cortina systems; Name: 双100TX/FX以太网PHY; 物料替代型号: EGLXT973QE.A3V工业温度; Ordering NO.: EGLXT973QEA3V; 物料型号说明: QFP100封装商业温度; Price: 70.01
footprint PQFP100/0.65 (Footprint not found)
part A pins: 6 AUTO_NEG0, 8 SD_2P5V/SPEED0, 10 DUPLEX0, 11 LED_CGF0, 18 FIBER_TP0, 20 MDDIS0, 24 PWRDWN0, 25 MDIO0, 26 MDC0, 29 RXD0_3, 30 RXD0_2, 31 RXD0_1, 32 RXD0_0, 33 RXDV0, 34 RXCLK0, 35 RXER0, 36 TXER0, 37 TXCLK0, 38 TXEN0, 39 TXD0_0, 42 TXD0_1, 43 TXD0_2, 44 TXD0_3, 45 COL0, 46 CRS0, 49 LED0_1, 50 LED0_2, 51 LED0_3, 56 TEST_0, 59 DPAP_0, 60 DPAN_0, 63 DPBP_0, 64 DPBN_0, 76 SD0, 78 TXSLEW0
part B pins: 1 TXD1_2, 2 TXD1_3, 3 COL1, 4 CRS1, 5 AUTO_NEG1, 7 SD_2P5V/SPEED1, 9 DUPLEX1, 12 LED_CGF1, 17 FIBER_TP1, 19 MDDIS1, 21 PWRDWN1, 22 MDC1, 23 MDIO1, 57 TEST_1, 67 DPBP_1, 68 DPBN_1, 71 DPAP_1, 72 DPAN_1, 75 SD1, 79 TXSLEW1, 80 LED1_3, 81 LED1_2, 82 LED1_1, 85 RXD1_3, 86 RXD1_2, 87 RXD1_1, 88 RXD1_0, 89 RXDV1, 92 RXCLK1, 93 RXER1, 94 TXER1, 97 TXCLK1, 98 TXEN1, 99 TXD1_0, 100 TXD1_1
part C pins: 13 RESET#, 14 SGND (power), 15 REFCLK, 16 GNDD (power), 27 VCCIO (power), 28 GNDIO (power), 40 VCCD (power), 41 GNDD (power), 47 VCCIO (power), 48 GNDIO (power), 52 ADDR4, 53 ADDR3, 54 ADDR2, 55 ADDR1, 58 VCCR (power), 61 GNDT (power), 62 GNDR (power), 65 VCCT (power), 66 VCCT (power), 69 GNDR (power), 70 GNDT (power), 73 VCCR (power), 74 VCCPECL (power), 77 GNDPECL (power), 83 GNDIO (power), 84 VCCIO (power), 90 GNDD (power), 91 VCCD (power), 95 GNDIO (power), 96 VCCIO (power)

## IMP706SCSA
designator U?